# Altium footprint library 智能锁实践教学平台.PcbLib: 58 footprints (part 2 of 4)
Each footprint in its own frame and in the unit in brackets; x right, y up, seen from the top. Pads: shape width x height; smd on the part's side, far side on the other; paste and mask are expansions set on the pad; w line width, h text height; cw(c..) or ccw(c..) is an arc to the next point about the centre after c.
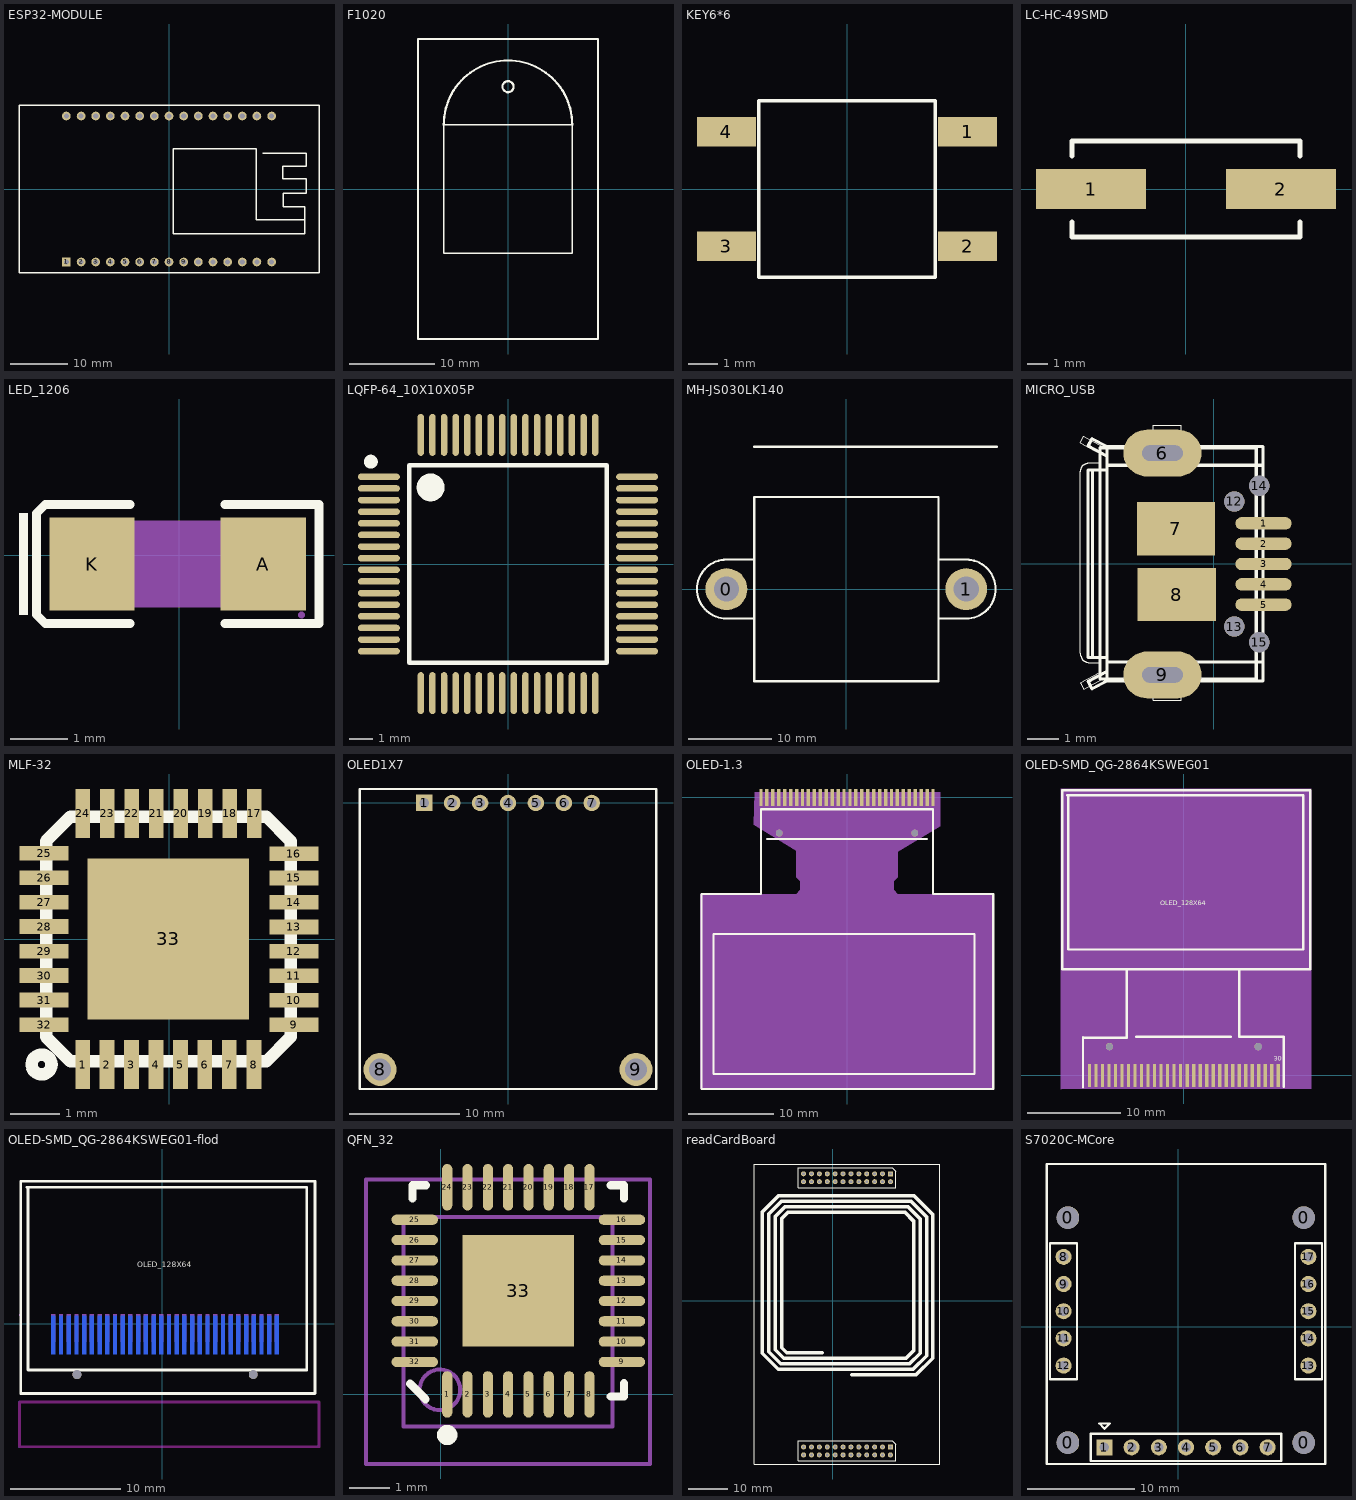
[diagram p1: the footprints below, top view; thin cyan lines are the x and y axes]

## ESP32-MODULE [mm]
pads (30):
  rect 1.5x1.5 hole 0.9: 1(-17.78,-12.65)
  round 1.5 hole 0.9: 2(-15.24,-12.65) 3(-12.7,-12.65) 4(-10.16,-12.65) 5(-7.62,-12.65) 6(-5.08,-12.65) 7(-2.54,-12.65) 8(0,-12.65) 9(2.54,-12.65) 10(5.08,-12.65) 11(7.62,-12.65) 12(10.16,-12.65) 13(12.7,-12.65) 14(15.24,-12.65) 15(17.78,-12.65) 16(17.78,12.65) 17(15.24,12.65) 18(12.7,12.65) 19(10.16,12.65) 20(7.62,12.65) 21(5.08,12.65) 22(2.54,12.65) 23(0,12.65) 24(-2.54,12.65) 25(-5.08,12.65) 26(-7.62,12.65) 27(-10.16,12.65) 28(-12.7,12.65) 29(-15.24,12.65) 30(-17.78,12.65)
Top Overlay:
  lines w0.254: 16.256,6.223 23.749,6.223 23.749,3.937 19.685,3.937 19.685,1.778 23.749,1.778 23.749,-0.762 19.812,-0.762 19.812,-3.048 23.495,-3.048 23.495,-7.747 0.762,-7.747 0.762,6.985 15.113,6.985 15.113,-5.334 23.495,-5.334 ; -26,-14.5 26,-14.5 26,14.5 -26,14.5 -26,-14.5

## F1020 [mm]
Top Overlay:
  circle w0.254: c0,11.938 r0.648
  lines w0.203: -10.5,-17.5 10.5,-17.5 10.5,17.5 -10.5,17.5 -10.5,-17.5 ; -7.5,-7.5 -7.5,7.5 7.5,7.5 7.5,-7.5 -7.5,-7.5
  lines w0.254: -7.5,7.5 cw(c0,7.5) 7.5,7.5

## KEY6*6 [mm]
pads (4):
  rect 2x1 smd: 1(4.1,1.95) 2(4.1,-1.95) 3(-4.1,-1.95) 4(-4.1,1.95)
Top Overlay:
  lines w0.127: -3,-3 -3,3 3,3 3,-3 -3,-3

## LC-HC-49SMD [mm]
height 12
pads (2):
  rect 5.5x2 smd: 1(-4.75,0) 2(4.75,0)
Top Overlay:
  lines w0.254: -5.7,-1.65 -5.7,-2.4 5.7,-2.4 5.7,-1.65 ; -5.7,1.65 -5.7,2.4 5.7,2.4 5.7,1.65
3D body: height 4, standoff 0, extent -6.7,-2.462 6.7,2.438

## LED_1206 [mm]
pads (2):
  rect 1.485x1.62 smd: A(1.467,-0.155) K(-1.518,-0.155)
Top Overlay:
  region: -2.642,-1.041 -2.642,0.731 -2.794,0.731 -2.794,-1.041
  lines w0.152: -0.852,-1.194 -2.337,-1.194 -2.489,-1.041 -2.489,0.731 -2.337,0.883 -0.852,0.883 ; 0.801,-1.194 2.438,-1.194 2.438,0.883 0.801,0.883
Top Paste:
  region: 0.724,-0.865 0.724,-0.531 0.824,-0.431 1.129,-0.431 1.229,-0.331 1.229,0.02 1.129,0.12 0.824,0.12 0.724,0.22 0.724,0.555 0.824,0.655 2.109,0.655 2.209,0.555 2.209,-0.865 2.109,-0.965 0.824,-0.965
  region: -0.776,-0.865 -0.776,-0.531 -0.876,-0.431 -1.18,-0.431 -1.28,-0.331 -1.28,0.02 -1.18,0.12 -0.876,0.12 -0.776,0.22 -0.776,0.555 -0.876,0.655 -2.161,0.655 -2.261,0.555 -2.261,-0.865 -2.161,-0.965 -0.876,-0.965
Mechanical 4:
  region: -1.526,-0.905 -1.526,0.595 1.474,0.595 1.474,-0.905
Mechanical 5:
  region: -1.526,-0.905 -1.526,0.595 -1.026,0.595 -1.026,-0.905
  region: 1.474,-0.905 1.474,0.595 0.974,0.595 0.974,-0.905
Mechanical 6:
  circle w0.06: c2.133,-1.044 r0.03
Mechanical 15:
  region: -1.346,-0.245 -1.346,-0.065 -0.626,-0.065 -0.626,-0.245
  region: 1.294,-0.245 1.294,-0.065 0.574,-0.065 0.574,-0.245
  region: 1.024,-0.755 1.024,0.445 0.844,0.445 0.844,-0.755

## LQFP-64_10X10X05P [mm]
pads (64):
  oval 1.8x0.28 smd: 1(-5.55,3.75) 2(-5.55,3.25) 3(-5.55,2.75) 4(-5.55,2.25) 5(-5.55,1.75) 6(-5.55,1.25) 7(-5.55,0.75) 8(-5.55,0.25) 9(-5.55,-0.25) 10(-5.55,-0.75) 11(-5.55,-1.25) 12(-5.55,-1.75) 13(-5.55,-2.25) 14(-5.55,-2.75) 15(-5.55,-3.25) 16(-5.55,-3.75) 33(5.55,-3.75) 34(5.55,-3.25) 35(5.55,-2.75) 36(5.55,-2.25) 37(5.55,-1.75) 38(5.55,-1.25) 39(5.55,-0.75) 40(5.55,-0.25) 41(5.55,0.25) 42(5.55,0.75) 43(5.55,1.25) 44(5.55,1.75) 45(5.55,2.25) 46(5.55,2.75) 47(5.55,3.25) 48(5.55,3.75)
  oval 0.28x1.8 smd: 17(-3.75,-5.55) 18(-3.25,-5.55) 19(-2.75,-5.55) 20(-2.25,-5.55) 21(-1.75,-5.55) 22(-1.25,-5.55) 23(-0.75,-5.55) 24(-0.25,-5.55) 25(0.25,-5.55) 26(0.75,-5.55) 27(1.25,-5.55) 28(1.75,-5.55) 29(2.25,-5.55) 30(2.75,-5.55) 31(3.25,-5.55) 32(3.75,-5.55) 49(3.75,5.55) 50(3.25,5.55) 51(2.75,5.55) 52(2.25,5.55) 53(1.75,5.55) 54(1.25,5.55) 55(0.75,5.55) 56(0.25,5.55) 57(-0.25,5.55) 58(-0.75,5.55) 59(-1.25,5.55) 60(-1.75,5.55) 61(-2.25,5.55) 62(-2.75,5.55) 63(-3.25,5.55) 64(-3.75,5.55)
Top Overlay:
  lines w0.2: -4.25,-4.25 4.25,-4.25 4.25,4.25 -4.25,4.25 -4.25,-4.25
  lines w0.3: -5.751,4.397 cw(c-5.901,4.398) -5.751,4.399
  lines w0.6: -3.025,3.294 cw(c-3.325,3.297) -3.025,3.299

## MH-JS030LK140 [mm]
pads (2):
  round 5 hole 3: 0(-14.32,0) 1(14.32,0)
Top Overlay:
  lines w0.254: -11,-3.52 -14.32,-3.52 cw(c-14.32,0) -14.32,3.52 -11,3.52 ; -11,17 18,17 ; 11,-3.52 14.32,-3.52 ccw(c14.32,0) 14.32,3.52 11,3.52 ; -11,-11 -11,11 11,11 11,-11 -11,-11

## MICRO_USB [mm]
pads (13):
  oval 1.8x0.4 smd: 1(1.6,1.29) 2(1.6,0.64) 3(1.6,-0.01) 4(1.6,-0.66) 5(1.6,-1.31)
  oval 2.5x1.5 hole 0.5 slot 1.3 at 0 deg: 6(-1.635,3.54) 9(-1.635,-3.56)
  rect 2.5x1.7 smd: 7(-1.205,1.116) 8(-1.176,-0.992)
  round 0.65 / inner round 0.55 / far side round 0.55 hole 0.65 unplated: 12(0.665,1.99) 13(0.665,-2.01)
  round 0.65 hole 0.65 unplated: 14(1.465,2.49) 15(1.465,-2.51)
Top Overlay:
  drawing of 691 lines, arcs and shapes, not listed

## MLF-32 [mm]
pads (33):
  rect 0.3x1 smd: 1(-1.766,-2.566) 2(-1.268,-2.566) 3(-0.767,-2.566) 4(-0.267,-2.566) 5(0.233,-2.566) 6(0.734,-2.566) 7(1.232,-2.566) 8(1.737,-2.566) 17(1.74,2.566) 18(1.242,2.566) 19(0.741,2.566) 20(0.241,2.566) 21(-0.259,2.566) 22(-0.76,2.566) 23(-1.26,2.566) 24(-1.76,2.566)
  rect 1x0.3 smd: 9(2.553,-1.752) 10(2.553,-1.255) 11(2.553,-0.752) 12(2.553,-0.251) 13(2.553,0.247) 14(2.553,0.749) 15(2.553,1.247) 16(2.553,1.745) 25(-2.553,1.753) 26(-2.553,1.255) 27(-2.553,0.752) 28(-2.553,0.254) 29(-2.553,-0.249) 30(-2.553,-0.747) 31(-2.553,-1.247) 32(-2.553,-1.75)
  rect 3.3x3.3 smd: 33(-0.013,0)
Top Overlay:
  circle w0.254: c-2.604,-2.565 r0.203
  lines w0.254: -2.513,-2 -2.013,-2.5 ; -2.513,2 -2.013,2.5 ; -2.512,-2 -2.512,2 ; -2.013,-2.498 1.987,-2.498 ; -2.013,2.501 1.987,2.501 ; 1.987,-2.5 2.487,-2 2.486,2 1.987,2.5

## OLED1X7 [mm] "Connector; Header; 7 Position"
pads (9):
  rect 1.5x1.5 hole 0.9: 1(-7.62,0)
  round 1.5 hole 0.9: 2(-5.08,0) 3(-2.54,0) 4(0,0) 5(2.54,0) 6(5.08,0) 7(7.62,0)
  round 3 hole 2: 8(-11.65,-24.254) 9(11.65,-24.254)
Top Overlay:
  lines w0.2: -13.5,-26.035 13.5,-26.035 13.5,1.27 -13.5,1.27 -13.5,-26.035

## OLED-1.3 [mm]
pads (32):
  rect 0.4x2 smd: 1(10.15,0) 2(9.45,0.001) 3(8.75,0) 4(8.05,0) 5(7.35,0) 6(6.65,0) 7(5.95,0) 8(5.25,0) 9(4.55,0) 10(3.85,0) 11(3.15,0) 12(2.45,0) 13(1.75,0) 14(1.05,0) 15(0.35,0) 16(-0.35,0) 17(-1.05,0) 18(-1.75,0) 19(-2.45,0.001) 20(-3.15,0) 21(-3.85,-0.001) 22(-4.55,0) 23(-5.25,0) 24(-5.95,0) 25(-6.65,0.001) 26(-7.35,0) 27(-8.05,0.001) 28(-8.75,0) 29(-9.45,0) 30(-10.15,0)
  round 0.8 hole 0.8 unplated: ""(-8,-4.2) ""(8,-4.2)
Top Overlay:
  lines w0.254: -9.442,-4.898 9.458,-4.898 ; -17.155,-34.4 17.25,-34.4 17.25,-11.4 10.858,-11.4 10.16,-11.4 10.158,-9.502 10.158,-1.388 -10.142,-1.388 -10.142,-11.4 -17.155,-11.4 -17.155,-34.4 ; -15.742,-32.65 15.058,-32.65 15.058,-30.798 15.058,-16.098 -15.742,-16.098 -15.742,-32.65
Mechanical 4:
  region: 11,0.6 11,-3.4 6,-6.4 6,-9.4 5.5,-9.9 5.5,-10.9 6,-11.4 17.3,-11.4 17.3,-34.4 -17.3,-34.4 -17.3,-11.4 -6,-11.4 -5.5,-10.9 -5.5,-9.9 -6,-9.4 -6,-6.3 -11,-3.2 -10.9,0.6
Mechanical 5:
  region: -10,-0.9 -10.3,-0.9 -10.3,0.6 -10,0.6
  region: -9.301,-0.9 -9.601,-0.9 -9.601,0.6 -9.301,0.6
  region: -8.6,-0.9 -8.9,-0.9 -8.9,0.6 -8.6,0.6
  region: -7.901,-0.9 -8.201,-0.9 -8.201,0.6 -7.901,0.6
  region: -7.2,-0.9 -7.5,-0.9 -7.5,0.6 -7.2,0.6
  region: -6.5,-0.9 -6.8,-0.9 -6.8,0.6 -6.5,0.6
  region: -5.8,-0.9 -6.1,-0.9 -6.1,0.6 -5.8,0.6
  region: -5.099,-0.9 -5.399,-0.9 -5.399,0.6 -5.099,0.6
  region: -4.4,-0.9 -4.7,-0.9 -4.7,0.6 -4.4,0.6
  region: -3.701,-0.9 -4.001,-0.9 -4.001,0.6 -3.701,0.6
  region: -3,-0.9 -3.3,-0.9 -3.3,0.6 -3,0.6
  region: -2.301,-0.9 -2.601,-0.9 -2.601,0.6 -2.301,0.6
  region: -1.6,-0.9 -1.9,-0.9 -1.9,0.6 -1.6,0.6
  region: -0.9,-0.9 -1.2,-0.9 -1.2,0.6 -0.9,0.6
  region: -0.2,-0.9 -0.5,-0.9 -0.5,0.6 -0.2,0.6
  region: 0.499,-0.9 0.199,-0.9 0.199,0.6 0.499,0.6
  region: 1.2,-0.9 0.9,-0.9 0.9,0.6 1.2,0.6
  region: 1.9,-0.9 1.6,-0.9 1.6,0.6 1.9,0.6
  region: 2.6,-0.9 2.3,-0.9 2.3,0.6 2.6,0.6
  region: 3.3,-0.9 3,-0.9 3,0.6 3.3,0.6
  region: 4,-0.9 3.7,-0.9 3.7,0.6 4,0.6
  region: 4.7,-0.9 4.4,-0.9 4.4,0.6 4.7,0.6
  region: 5.4,-0.9 5.1,-0.9 5.1,0.6 5.4,0.6
  region: 6.1,-0.9 5.8,-0.9 5.8,0.6 6.1,0.6
  region: 6.8,-0.9 6.5,-0.9 6.5,0.6 6.8,0.6
  region: 7.5,-0.9 7.2,-0.9 7.2,0.6 7.5,0.6
  region: 8.2,-0.9 7.9,-0.9 7.9,0.6 8.2,0.6
  region: 8.9,-0.9 8.6,-0.9 8.6,0.6 8.9,0.6
  region: 9.601,-0.9 9.301,-0.9 9.301,0.6 9.601,0.6
  region: 10.3,-0.9 10,-0.9 10,0.6 10.3,0.6

## OLED-SMD_QG-2864KSWEG01 [mm]
pads (32):
  rect 0.351x2.499 smd: 1(-10.149,-0.002) 2(-9.444,0) 3(-8.744,0) 4(-8.044,0) 5(-7.344,0) 6(-6.644,0) 7(-5.944,0) 8(-5.244,0) 9(-4.544,0) 10(-3.844,0) 11(-3.144,0) 12(-2.444,0) 13(-1.744,0) 14(-1.044,0) 15(-0.344,0) 16(0.356,0) 17(1.056,0) 18(1.756,0) 19(2.456,0) 20(3.156,0) 21(3.856,0) 22(4.556,0) 23(5.256,0) 24(5.956,0) 25(6.656,0) 26(7.356,0) 27(8.056,0) 28(8.751,0.001) 29(9.45,0.002) 30(10.149,0.002)
  round 0.8 hole 0.8 unplated: ""(-8,3.1) ""(8,3.1)
Top Overlay:
  lines w0.254: -12.442,30.16 12.858,30.16 12.858,13.56 -12.442,13.56 -12.442,30.06 -12.542,30.16 -12.242,30.16 -11.842,30.16 ; -10.848,-1.302 -10.848,4.098 ; -10.842,4.06 -6.142,4.06 -6.142,11.46 ; -5.142,4.16 5.058,4.16 ; 5.958,11.36 5.958,4.16 10.758,4.16 ; 10.752,-1.202 10.752,4.198 ; -13.1,11.44 -13.1,30.7 13.6,30.7 13.6,11.44 -13.1,11.44
  text "30" at 9.666,1.561 h0.51
  text "OLED_128X64" at -2.541,18.313 h0.51
Mechanical 4:
  region: -13.227,30.827 13.727,30.827 13.727,-1.429 -13.227,-1.429
Mechanical 5:
  circle w0.3: c8,3.1 r0.15
  circle w0.3: c-8,3.1 r0.15
  region: 10.324,1.252 10.324,-1.247 9.974,-1.247 9.974,1.252
  region: 9.625,1.252 9.625,-1.247 9.275,-1.247 9.275,1.252
  region: 8.926,1.251 8.926,-1.248 8.576,-1.248 8.576,1.251
  region: 8.231,1.249 8.231,-1.25 7.881,-1.25 7.881,1.249
  region: 7.531,1.249 7.531,-1.25 7.181,-1.25 7.181,1.249
  region: 6.831,1.249 6.831,-1.25 6.481,-1.25 6.481,1.249
  region: 6.131,1.249 6.131,-1.25 5.781,-1.25 5.781,1.249
  region: 5.431,1.249 5.431,-1.25 5.081,-1.25 5.081,1.249
  region: 4.731,1.249 4.731,-1.25 4.381,-1.25 4.381,1.249
  region: 4.031,1.249 4.031,-1.25 3.681,-1.25 3.681,1.249
  region: 3.331,1.249 3.331,-1.25 2.981,-1.25 2.981,1.249
  region: 2.631,1.249 2.631,-1.25 2.281,-1.25 2.281,1.249
  region: 1.931,1.249 1.931,-1.25 1.581,-1.25 1.581,1.249
  region: 1.231,1.249 1.231,-1.25 0.881,-1.25 0.881,1.249
  region: 0.531,1.249 0.531,-1.25 0.181,-1.25 0.181,1.249
  region: -0.169,1.249 -0.169,-1.25 -0.519,-1.25 -0.519,1.249
  region: -0.869,1.249 -0.869,-1.25 -1.219,-1.25 -1.219,1.249
  region: -1.569,1.249 -1.569,-1.25 -1.919,-1.25 -1.919,1.249
  region: -2.269,1.249 -2.269,-1.25 -2.619,-1.25 -2.619,1.249
  region: -2.969,1.249 -2.969,-1.25 -3.319,-1.25 -3.319,1.249
  region: -3.669,1.249 -3.669,-1.25 -4.019,-1.25 -4.019,1.249
  region: -4.369,1.249 -4.369,-1.25 -4.719,-1.25 -4.719,1.249
  region: -5.069,1.249 -5.069,-1.25 -5.419,-1.25 -5.419,1.249
  region: -5.769,1.249 -5.769,-1.25 -6.119,-1.25 -6.119,1.249
  region: -6.469,1.249 -6.469,-1.25 -6.819,-1.25 -6.819,1.249
  region: -7.169,1.249 -7.169,-1.25 -7.519,-1.25 -7.519,1.249
  region: -7.869,1.249 -7.869,-1.25 -8.219,-1.25 -8.219,1.249
  region: -8.569,1.249 -8.569,-1.25 -8.919,-1.25 -8.919,1.249
  region: -9.269,1.249 -9.269,-1.25 -9.619,-1.25 -9.619,1.249
  region: -9.974,1.247 -9.974,-1.252 -10.324,-1.252 -10.324,1.247
Mechanical 6:
  circle w0.06: c-13.227,-1.429 r0.03

## OLED-SMD_QG-2864KSWEG01-flod [mm]
pads (32):
  rect 0.351x3.5 smd far side: 1(-9.895,-1.018) 2(-9.19,-1.018) 3(-8.49,-1.018) 4(-7.79,-1.018) 5(-7.09,-1.018) 6(-6.39,-1.018) 7(-5.69,-1.018) 8(-4.99,-1.018) 9(-4.29,-1.018) 10(-3.59,-1.018) 11(-2.89,-1.018) 12(-2.19,-1.018) 13(-1.49,-1.018) 14(-0.79,-1.018) 15(-0.09,-1.018) 16(0.61,-1.018) 17(1.31,-1.018) 18(2.01,-1.018) 19(2.71,-1.018) 20(3.41,-1.018) 21(4.11,-1.018) 22(4.81,-1.018) 23(5.51,-1.018) 24(6.21,-1.018) 25(6.91,-1.018) 26(7.61,-1.018) 27(8.31,-1.018) 28(9.005,-1.018) 29(9.704,-1.018) 30(10.403,-1.018)
  round 0.8 hole 0.8 unplated: ""(-7.746,-4.624) ""(8.254,-4.624)
Top Overlay:
  lines w0.254: -12.188,12.38 13.112,12.38 13.112,-4.22 -12.188,-4.22 -12.188,12.28 -12.288,12.38 -11.988,12.38 -11.588,12.38 ; -12.846,-6.34 -12.846,12.92 13.854,12.92 13.854,-6.34 -12.846,-6.34
  text "OLED_128X64" at -2.287,5.105 h0.51
Bottom Overlay:
  lines w0.254: -10.594,-5.622 -10.594,-0.222 ; -10.588,-5.584 -5.888,-5.584 ; -4.888,-5.684 5.312,-5.684 ; 6.212,-5.684 11.012,-5.684 ; 11.006,-5.722 11.006,-0.322
  text "30" at 9.92,-3.085 h0.51
Keep-Out Layer:
  lines w0.254: -12.954,-11.176 14.224,-11.176 14.224,-7.112 -12.954,-7.112 -12.954,-11.176
Mechanical 5:
  circle w0.3: c-7.746,-4.624 r0.15
  circle w0.3: c8.254,-4.624 r0.15
  region: -9.72,-1.666 -9.72,0.833 -10.07,0.833 -10.07,-1.666
  region: -9.015,-1.666 -9.015,0.833 -9.365,0.833 -9.365,-1.666
  region: -8.315,-1.666 -8.315,0.833 -8.665,0.833 -8.665,-1.666
  region: -7.615,-1.666 -7.615,0.833 -7.965,0.833 -7.965,-1.666
  region: -6.915,-1.666 -6.915,0.833 -7.265,0.833 -7.265,-1.666
  region: -6.215,-1.666 -6.215,0.833 -6.565,0.833 -6.565,-1.666
  region: -5.515,-1.666 -5.515,0.833 -5.865,0.833 -5.865,-1.666
  region: -4.815,-1.666 -4.815,0.833 -5.165,0.833 -5.165,-1.666
  region: -4.115,-1.666 -4.115,0.833 -4.465,0.833 -4.465,-1.666
  region: -3.415,-1.666 -3.415,0.833 -3.765,0.833 -3.765,-1.666
  region: -2.715,-1.666 -2.715,0.833 -3.065,0.833 -3.065,-1.666
  region: -2.015,-1.666 -2.015,0.833 -2.365,0.833 -2.365,-1.666
  region: -1.315,-1.666 -1.315,0.833 -1.665,0.833 -1.665,-1.666
  region: -0.615,-1.666 -0.615,0.833 -0.965,0.833 -0.965,-1.666
  region: 0.085,-1.666 0.085,0.833 -0.265,0.833 -0.265,-1.666
  region: 0.785,-1.666 0.785,0.833 0.435,0.833 0.435,-1.666
  region: 1.485,-1.666 1.485,0.833 1.135,0.833 1.135,-1.666
  region: 2.185,-1.666 2.185,0.833 1.835,0.833 1.835,-1.666
  region: 2.885,-1.666 2.885,0.833 2.535,0.833 2.535,-1.666
  region: 3.585,-1.666 3.585,0.833 3.235,0.833 3.235,-1.666
  region: 4.285,-1.666 4.285,0.833 3.935,0.833 3.935,-1.666
  region: 4.985,-1.666 4.985,0.833 4.635,0.833 4.635,-1.666
  region: 5.685,-1.666 5.685,0.833 5.335,0.833 5.335,-1.666
  region: 6.385,-1.666 6.385,0.833 6.035,0.833 6.035,-1.666
  region: 7.085,-1.666 7.085,0.833 6.735,0.833 6.735,-1.666
  region: 7.785,-1.666 7.785,0.833 7.435,0.833 7.435,-1.666
  region: 8.485,-1.666 8.485,0.833 8.135,0.833 8.135,-1.666
  region: 9.18,-1.666 9.18,0.833 8.83,0.833 8.83,-1.666
  region: 9.879,-1.666 9.879,0.833 9.529,0.833 9.529,-1.666
  region: 10.578,-1.666 10.578,0.833 10.228,0.833 10.228,-1.666
Mechanical 6:
  circle w0.06: c-12.973,0.773 r0.03

## QFN_32 [mm]
height 0.8
pads (33):
  oval 0.25x1.143 smd: 1(0.155,-0.01) 2(0.655,-0.01) 3(1.155,-0.01) 4(1.655,-0.01) 5(2.155,-0.01) 6(2.655,-0.01) 7(3.155,-0.01) 8(3.655,-0.01) 17(3.655,5.09) 18(3.155,5.09) 19(2.655,5.09) 20(2.155,5.09) 21(1.655,5.09) 22(1.155,5.09) 23(0.655,5.09) 24(0.155,5.09)
  oval 1.143x0.25 smd: 9(4.455,0.79) 10(4.455,1.29) 11(4.455,1.79) 12(4.455,2.29) 13(4.455,2.79) 14(4.455,3.29) 15(4.455,3.79) 16(4.455,4.29) 25(-0.645,4.29) 26(-0.645,3.79) 27(-0.645,3.29) 28(-0.645,2.79) 29(-0.645,2.29) 30(-0.645,1.79) 31(-0.645,1.29) 32(-0.645,0.79)
  rect 2.743x2.743 smd: 33(1.905,2.54)
Top Overlay:
  circle w0.25: c0.155,-1.01 r0.125
  lines w0.2: -0.695,4.815 -0.695,5.14 -0.37,5.14 ; 4.18,-0.06 4.505,-0.06 4.505,0.265 ; 4.18,5.14 4.505,5.14 4.505,4.815
  lines w0.203: -0.762,0.254 -0.381,-0.127
Mechanical 13:
  circle w0.1: c-0.024,0.103 r0.5
  lines w0.1: -0.924,-0.797 -0.924,4.353 4.226,4.353 4.226,-0.797 -0.924,-0.797
Mechanical 15:
  lines w0.1: 1.151,1.778 2.151,1.778 ; 1.651,1.278 1.651,2.278 ; -1.849,-1.722 -1.849,5.278 5.151,5.278 5.151,-1.722 -1.849,-1.722

## readCardBoard [mm]
pads (48):
  rect 1.27x1.27 / inner round 1.524 / far side rect 1.27x1.27 hole 0.7: 1(14.561,-37.1) 25(14.561,32.115)
  round 1.27 / inner round 1.524 / far side round 1.27 hole 0.7: 2(14.561,-39.1) 3(12.561,-37.1) 4(12.561,-39.1) 5(10.561,-37.1) 6(10.561,-39.1) 7(8.561,-37.1) 8(8.561,-39.1) 9(6.561,-37.1) 10(6.561,-39.1) 11(4.561,-37.1) 12(4.561,-39.1) 13(2.561,-37.1) 14(2.561,-39.1) 15(0.561,-37.1) 16(0.561,-39.1) 17(-1.439,-37.1) 18(-1.439,-39.1) 19(-3.439,-37.1) 20(-3.439,-39.1) 21(-5.439,-37.1) 22(-5.439,-39.1) 23(-7.439,-37.1) 24(-7.439,-39.1) 26(14.561,30.115) 27(12.561,32.115) 28(12.561,30.115) 29(10.561,32.115) 30(10.561,30.115) 31(8.561,32.115) 32(8.561,30.115) 33(6.561,32.115) 34(6.561,30.115) 35(4.561,32.115) 36(4.561,30.115) 37(2.561,32.115) 38(2.561,30.115) 39(0.561,32.115) 40(0.561,30.115) 41(-1.439,32.115) 42(-1.439,30.115) 43(-3.439,32.115) 44(-3.439,30.115) 45(-5.439,32.115) 46(-5.439,30.115) 47(-7.439,32.115) 48(-7.439,30.115)
Top Overlay:
  lines w0.203: -19.939,-41.402 27.061,-41.402 27.061,34.598 -19.939,34.598 -19.939,-41.402 ; -8.8,-40.64 15.861,-40.64 15.861,-36.43 14.991,-35.56 -8.8,-35.56 -8.8,-40.64 ; -8.8,28.575 15.861,28.575 15.861,32.785 14.991,33.655 -8.8,33.655 -8.8,28.575
  lines w0.965: -2.718,-13.208 -11.684,-13.208 -12.954,-11.938 -12.954,20.828 -11.404,22.378 18.262,22.378 20.447,20.193 20.447,-12.7 18.542,-14.605 -12.446,-14.605 -14.605,-12.446 -14.605,21.336 -12.166,23.775 19.024,23.775 22.098,20.701 22.098,-13.335 19.431,-16.002 -13.208,-16.002 -16.256,-12.954 -16.256,21.971 -13.055,25.172 19.786,25.172 23.749,21.209 23.749,-13.97 20.32,-17.399 -13.843,-17.399 -17.907,-13.335 -17.907,22.479 -13.817,26.569 20.548,26.569 25.273,21.844 25.273,-14.605 21.082,-18.796 4.826,-18.796
Mechanical 8:
  text "3" at 12.307,-37.1 h0.64
  text "15" at 0.053,-37.1 h0.64
  text "14" at 2.053,-39.1 h0.64
  text "4" at 12.307,-39.1 h0.64
  text "13" at 2.053,-37.1 h0.64
  text "17" at -1.947,-37.1 h0.64
  text "18" at -1.947,-39.1 h0.64
  text "19" at -3.947,-37.1 h0.64
  text "20" at -3.947,-39.1 h0.64
  text "16" at 0.053,-39.1 h0.64
  text "8" at 8.307,-39.1 h0.64
  text "10" at 6.053,-39.1 h0.64
  text "7" at 8.307,-37.1 h0.64
  text "9" at 6.307,-37.1 h0.64
  text "12" at 4.053,-39.1 h0.64
  text "11" at 4.053,-37.1 h0.64
  text "6" at 10.307,-39.1 h0.64
  text "5" at 10.307,-37.1 h0.64
  text "1" at 14.307,-37.1 h0.64
  text "2" at 14.307,-39.1 h0.64
  text "3" at 12.307,32.115 h0.64
  text "15" at 0.053,32.115 h0.64
  text "14" at 2.053,30.115 h0.64
  text "4" at 12.307,30.115 h0.64
  text "13" at 2.053,32.115 h0.64
  text "17" at -1.947,32.115 h0.64
  text "18" at -1.947,30.115 h0.64
  text "19" at -3.947,32.115 h0.64
  text "20" at -3.947,30.115 h0.64
  text "16" at 0.053,30.115 h0.64
  text "8" at 8.307,30.115 h0.64
  text "10" at 6.053,30.115 h0.64
  text "7" at 8.307,32.115 h0.64
  text "9" at 6.307,32.115 h0.64
  text "12" at 4.053,30.115 h0.64
  text "11" at 4.053,32.115 h0.64
  text "6" at 10.307,30.115 h0.64
  text "5" at 10.307,32.115 h0.64
  text "1" at 14.307,32.115 h0.64
  text "2" at 14.307,30.115 h0.64

## S7020C-MCore [mm]
pads (21):
  round 2.1 hole 2.1 unplated: 0(-10.268,-10.807) 0(-10.268,10.193) 0(11.732,-10.807) 0(11.732,10.193)
  rect 1.5x1.5 hole 0.9: 1(-6.874,-11.252)
  round 1.5 hole 0.9: 2(-4.334,-11.252) 3(-1.794,-11.252) 4(0.746,-11.252) 5(3.286,-11.252) 6(5.826,-11.252) 7(8.366,-11.252) 8(-10.683,6.528) 9(-10.683,3.988) 10(-10.683,1.448) 11(-10.683,-1.092) 12(-10.683,-3.632) 13(12.177,-3.632) 14(12.177,-1.092) 15(12.177,1.448) 16(12.177,3.988) 17(12.177,6.528)
Top Overlay:
  lines w0.2: -12.253,-12.811 -12.253,15.189 ; -12.243,-12.811 13.732,-12.811 ; -12.243,15.189 13.736,15.189 ; 13.746,-12.807 13.746,15.189 ; -11.953,-4.902 -11.953,7.798 -9.413,7.798 -9.413,-4.902 -11.953,-4.902 ; -8.144,-12.522 -8.144,-9.982 9.636,-9.982 9.636,-12.522 -8.144,-12.522 ; -7.366,-9.017 -6.35,-9.017 -6.858,-9.525 -7.366,-9.017 ; 10.907,-4.902 10.907,7.798 13.447,7.798 13.447,-4.902 10.907,-4.902
Keep-Out Layer:
  lines w0.127: 13.732,-12.791 13.736,-12.787